# Altium footprint library RcMPPTLib.PcbLib: 82 footprints (part 2 of 6)
Each footprint in its own frame and in the unit in brackets; x right, y up, seen from the top. Pads: shape width x height; smd on the part's side, far side on the other; paste and mask are expansions set on the pad; w line width, h text height; cw(c..) or ccw(c..) is an arc to the next point about the centre after c.
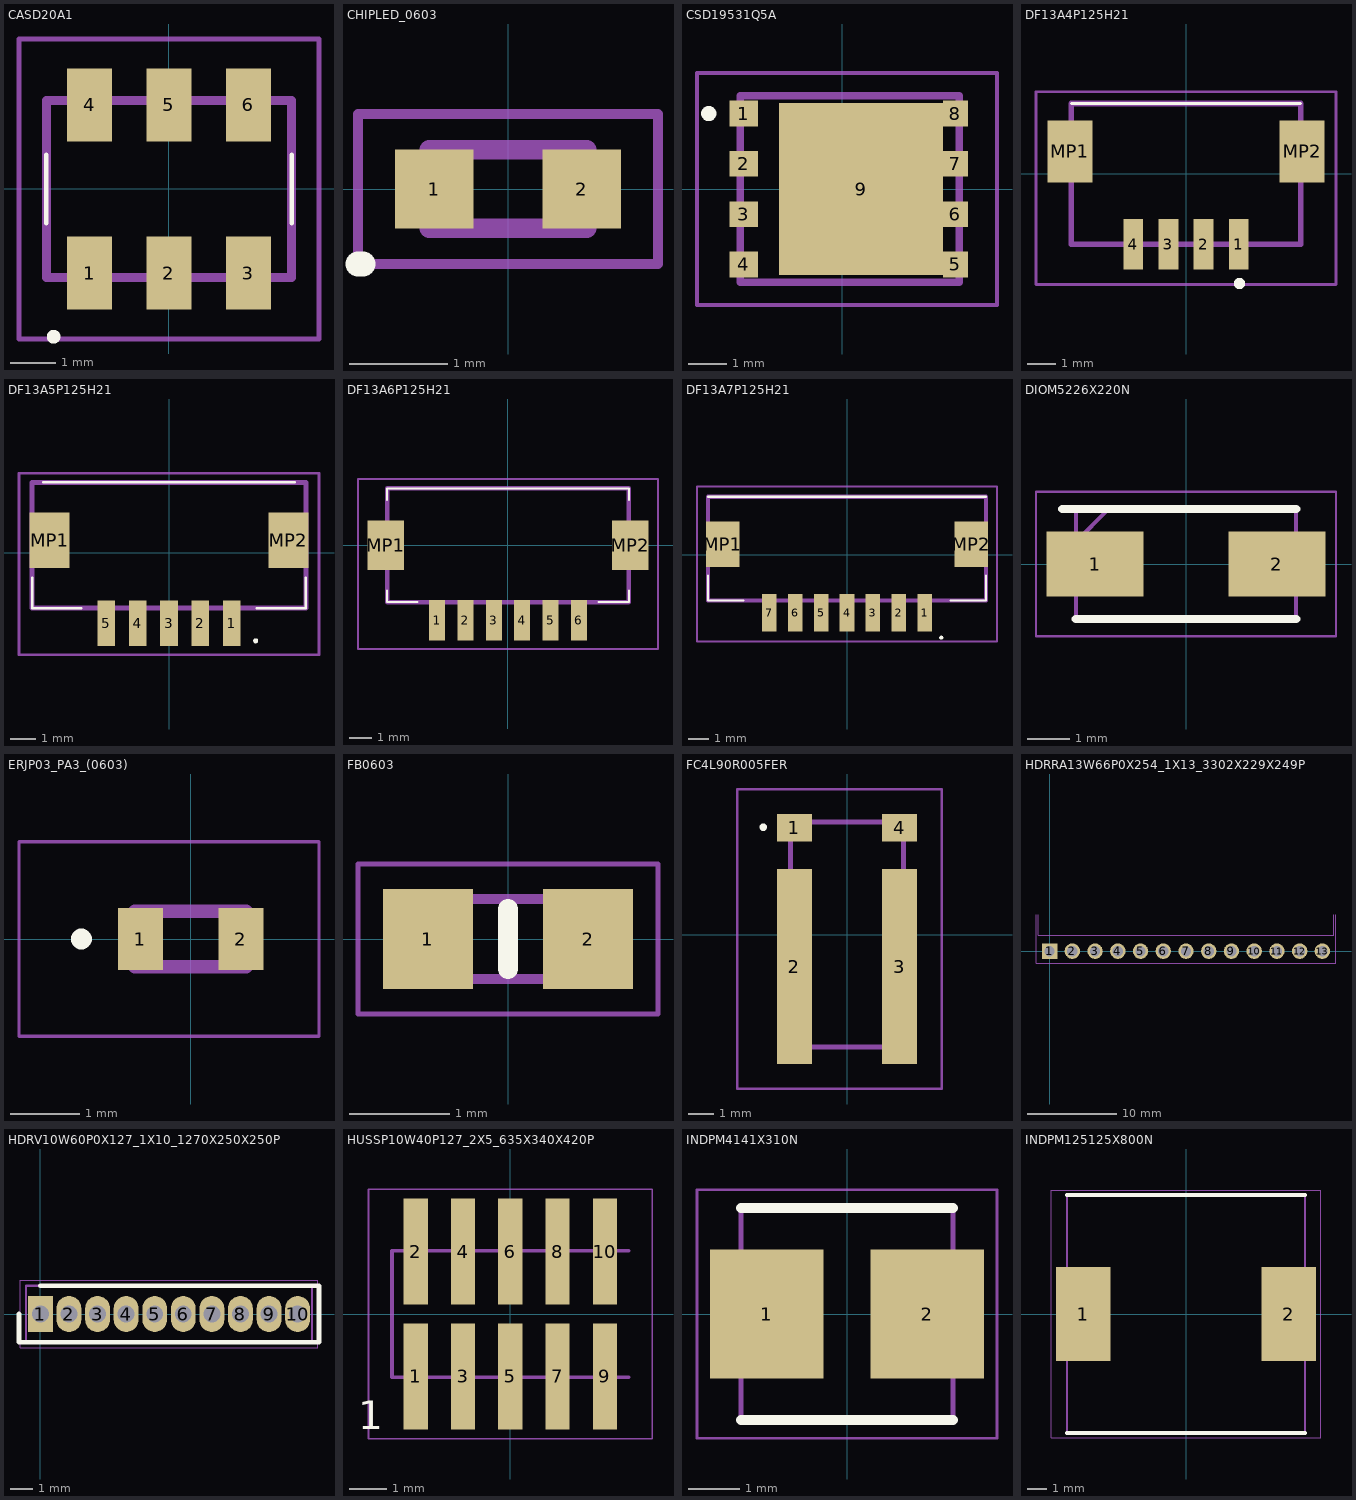
[diagram p1: the footprints below, top view; thin cyan lines are the x and y axes]

## CASD20A1 [mm]
pads (6):
  rect 1x1.6 smd: 1(-1.75,-1.85) 2(0,-1.85) 3(1.75,-1.85) 4(-1.75,1.85) 5(0,1.85) 6(1.75,1.85)
Top Overlay:
  lines w0.1: -2.7,-0.75 -2.7,0.75 -2.7,-0.75 ; 2.7,-0.75 2.7,0.75 2.7,-0.75
  lines w0.2: -2.54,-3.302 ccw(c-2.54,-3.252) -2.54,-3.202 ccw(c-2.54,-3.252) -2.54,-3.302
Mechanical 13:
  lines w0.2: -2.7,-1.95 -2.7,1.95 2.7,1.95 2.7,-1.95 -2.7,-1.95
Mechanical 15:
  lines w0.1: -3.302,-3.302 -3.302,3.302 3.302,3.302 3.302,-3.302 -3.302,-3.302
3D body "CAS-D20A1.stp": height 2.6, standoff 0, extent -2.7,-2.55 2.7,2.55

## CHIPLED_0603 [mm]
pads (2):
  rect 0.8x0.8 smd: 1(-0.75,0) 2(0.75,0)
Top Overlay:
  lines w0.254: -1.524,-0.762 -1.473,-0.762
Mechanical 13:
  lines w0.2: -0.8,-0.4 0.8,-0.4 0.8,0.4 -0.8,0.4 -0.8,-0.4
Mechanical 15:
  lines w0.1: -1.524,-0.762 1.524,-0.762 1.524,0.762 -1.524,0.762 -1.524,-0.762
3D body "LG_Q396-PS-35.stp": height 0.5, standoff 0, extent -0.8,-0.4 0.8,0.4

## CSD19531Q5A [mm]
pads (9):
  rect 0.75x0.675 smd: 1(-2.579,1.98) 2(-2.579,0.66) 3(-2.579,-0.66) 4(-2.579,-1.98)
  rect 0.655x0.675 smd: 5(2.974,-1.98) 6(2.974,-0.66) 7(2.974,0.66) 8(2.974,1.98)
  rect 4.295x4.51 smd: 9(0.496,0)
Top Overlay:
  lines w0.2: -3.602,1.98 ccw(c-3.502,1.98) -3.402,1.98 ccw(c-3.502,1.98) -3.602,1.98
Mechanical 13:
  lines w0.2: -2.677,-2.45 -2.677,2.45 3.073,2.45 3.073,-2.45 -2.677,-2.45
Mechanical 15:
  lines w0.1: -3.81,-3.048 4.064,-3.048 4.064,3.048 -3.81,3.048 -3.81,-3.048
3D body "CSD19531Q5A.stp": height 1.2, standoff 0, extent -2.886,-2.45 3.236,2.45

## DF13A4P125H21 [mm]
pads (6):
  rect 0.7x1.8 smd: 1(1.875,-2.5) 2(0.625,-2.5) 3(-0.625,-2.5) 4(-1.875,-2.5)
  rect 1.6x2.2 smd: MP1(-4.125,0.8) MP2(4.125,0.8)
Top Overlay:
  lines w0.1: -4.075,2.5 4.075,2.5
  lines w0.2: 1.9,-4 cw(c1.9,-3.9) 1.9,-3.8 cw(c1.9,-3.9) 1.9,-4
Mechanical 13:
  lines w0.2: -4.075,-2.5 4.075,-2.5 4.075,2.5 -4.075,2.5 -4.075,-2.5
Mechanical 15:
  lines w0.1: -5.334,-3.937 5.334,-3.937 5.334,2.921 -5.334,2.921 -5.334,-3.937
3D body "DF13A-4P-1.25H_21_.stp": height 3.7, standoff 0, extent -4.765,-3.33 4.765,2.5

## DF13A5P125H21 [mm]
pads (7):
  rect 0.7x1.8 smd: 1(2.5,-2.8) 2(1.25,-2.8) 3(0,-2.8) 4(-1.25,-2.8) 5(-2.5,-2.8)
  rect 1.6x2.2 smd: MP1(-4.75,0.5) MP2(4.75,0.5)
Top Overlay:
  lines w0.1: -5.45,-1 -5.45,-2.2 -3.5,-2.2 ; -5,2.8 5,2.8 ; 3.5,-2.2 5.45,-2.2 5.45,-1 ; 3.4,-3.5 ccw(c3.45,-3.5) 3.5,-3.5 ccw(c3.45,-3.5) 3.4,-3.5
Mechanical 13:
  lines w0.2: -5.45,-2.2 -5.45,2.8 5.45,2.8 5.45,-2.2 -5.45,-2.2
Mechanical 15:
  lines w0.1: -5.969,-4.064 -5.969,3.175 5.969,3.175 5.969,-4.064 -5.969,-4.064
3D body "DF13A-5P-1.25H_21_.stp": height 3.85, standoff 0, extent -5.45,-3.63 5.45,2.8

## DF13A6P125H21 [mm]
pads (8):
  rect 0.7x1.8 smd: 1(-3.125,-3.3) 2(-1.875,-3.3) 3(-0.625,-3.3) 4(0.625,-3.3) 5(1.875,-3.3) 6(3.125,-3.3)
  rect 1.6x2.2 smd: MP1(-5.375,0) MP2(5.375,0)
Top Overlay:
  lines w0.1: -5.325,-2 -5.325,-2.5 -4,-2.5 ; -5.325,2 -5.325,2.5 5.325,2.5 5.325,2 ; 4,-2.5 5.325,-2.5 5.325,-2
Mechanical 13:
  lines w0.2: -5.325,-2.5 -5.325,2.5 5.325,2.5 5.325,-2.5 -5.325,-2.5
Mechanical 15:
  lines w0.1: -6.604,-4.572 -6.604,2.921 6.604,2.921 6.604,-4.572 -6.604,-4.572
3D body "DF13A-6P-1.25H_21_.stp": height 3.85, standoff 0, extent -6.015,-4.13 6.015,2.5

## DF13A7P125H21 [mm]
pads (9):
  rect 0.7x1.8 smd: 1(3.75,-2.8) 2(2.5,-2.8) 3(1.25,-2.8) 4(0,-2.8) 5(-1.25,-2.8) 6(-2.5,-2.8) 7(-3.75,-2.8)
  rect 1.6x2.2 smd: MP1(-6,0.5) MP2(6,0.5)
Top Overlay:
  lines w0.1: -6.7,-1 -6.7,-2.2 -5,-2.2 ; -6.7,2.8 6.7,2.8 ; 5,-2.2 6.7,-2.2 6.7,-1 ; 4.5,-4 cw(c4.55,-4) 4.6,-4 cw(c4.55,-4) 4.5,-4
Mechanical 13:
  lines w0.2: -6.7,-2.2 -6.7,2.8 6.7,2.8 6.7,-2.2 -6.7,-2.2
Mechanical 15:
  lines w0.1: -7.239,-4.191 -7.239,3.302 7.239,3.302 7.239,-4.191 -7.239,-4.191
3D body "DF13A-7P-1.25H_21_.stp": height 3.85, standoff 0, extent -6.7,-3.63 6.7,2.8

## DIOM5226X220N [mm]
pads (2):
  rect 2.3x1.55 smd: 1(-2.15,0) 2(2.15,0)
Top Overlay:
  lines w0.2: -2.925,1.302 2.605,1.302 ; -2.605,-1.302 2.605,-1.302
Mechanical 13:
  lines w0.1: -2.605,0.528 -1.83,1.302 ; -2.605,-1.302 -2.605,1.302 2.605,1.302 2.605,-1.302 -2.605,-1.302
Mechanical 15:
  lines w0.05: -3.55,-1.71 -3.55,1.71 3.55,1.71 3.55,-1.71 -3.55,-1.71
3D body "MBRA120ET3G.stp": height 2.2, standoff 0, extent -2.605,-1.302 2.605,1.302

## ERJP03_PA3_(0603) [mm]
pads (2):
  rect 0.65x0.9 smd: 1(-0.725,0) 2(0.725,0)
Top Overlay:
  circle w0.2: c-1.575,0 r0.05
Mechanical 13:
  lines w0.2: -0.8,-0.4 -0.8,0.4 0.8,0.4 0.8,-0.4 -0.8,-0.4
Mechanical 15:
  lines w0.05: -2.475,-1.4 -2.475,1.4 1.85,1.4 1.85,-1.4 -2.475,-1.4
3D body "ERJ-PA3J104V.stp": height 0.45, standoff 0, extent -0.8,-0.4 0.8,0.4

## FB0603 [mm]
pads (2):
  rect 0.9x1 smd: 1(-0.8,0) 2(0.8,0)
Top Overlay:
  lines w0.2: 0,-0.3 0,0.3
Mechanical 13:
  lines w0.1: -0.8,-0.4 -0.8,0.4 0.8,0.4 0.8,-0.4 -0.8,-0.4
Mechanical 15:
  lines w0.05: -1.5,-0.75 -1.5,0.75 1.5,0.75 1.5,-0.75 -1.5,-0.75
3D body "MPZ1608S221ATA00.stp": height 0.75, standoff 0, extent -0.8,-0.4 0.8,0.4

## FC4L90R005FER [mm]
pads (4):
  rect 1.4x1.1 smd: 1(-2.1,4.275) 4(2.1,4.275)
  rect 1.4x7.8 smd: 2(-2.1,-1.275) 3(2.1,-1.275)
Top Overlay:
  lines w0.2: -3.4,4.3 ccw(c-3.35,4.3) -3.3,4.3 ; -3.4,4.3 cw(c-3.35,4.3) -3.3,4.3 ; -3.4,4.3 ccw(c-3.35,4.3) -3.3,4.3
Mechanical 13:
  lines w0.2: -2.25,-4.5 -2.25,4.5 2.25,4.5 2.25,-4.5 -2.25,-4.5
Mechanical 15:
  lines w0.1: -4.4,-6.175 -4.4,5.825 3.8,5.825 3.8,-6.175 -4.4,-6.175
3D body "FC4L90R005FER.stp": height 0.9, standoff 0, extent -2.69,-5.035 2.69,4.715

## HDRRA13W66P0X254_1X13_3302X229X249P [mm]
pads (13):
  rect 1.725x1.725 hole 1.15: 1(0,0)
  round 1.725 hole 1.15: 2(2.54,0) 3(5.08,0) 4(7.62,0) 5(10.16,0) 6(12.7,0) 7(15.24,0) 8(17.78,0) 9(20.32,0) 10(22.86,0) 11(25.4,0) 12(27.94,0) 13(30.48,0)
Mechanical 13:
  lines w0.1: -1.27,4.07 -1.27,1.78 31.75,1.78 31.75,4.07
Mechanical 15:
  lines w0.05: -1.52,4.064 -1.52,-1.362 32,-1.362 32,4.064
3D body "22-28-8133.stp": height 2.49, standoff -3.05, extent -1.27,-0.33 31.75,12.68

## HDRV10W60P0X127_1X10_1270X250X250P [mm]
pads (10):
  rect 1.1x1.6 hole 0.75: 1(0,0)
  oval 1.1x1.6 hole 0.75: 2(1.27,0) 3(2.54,0) 4(3.81,0) 5(5.08,0) 6(6.35,0) 7(7.62,0) 8(8.89,0) 9(10.16,0) 10(11.43,0)
Top Overlay:
  lines w0.2: -0.95,0 -0.95,-1.25 12.38,-1.25 12.38,1.25 0,1.25
Top Solder:
  lines w0.9: 0,0 11.43,0
Bottom Solder:
  lines w0.9: 0,0 11.43,0
Mechanical 13:
  lines w0.1: -0.635,-1.25 12.065,-1.25 12.065,1.25 -0.635,1.25 -0.635,-1.25
Mechanical 15:
  lines w0.05: -0.885,-1.5 12.315,-1.5 12.315,1.5 -0.885,1.5 -0.885,-1.5
3D body "M52-040023V1045.stp": height 2.5, standoff -2.3, extent -0.635,-1.25 12.065,1.25

## HUSSP10W40P127_2X5_635X340X420P [mm]
pads (10):
  rect 0.65x2.85 smd: 1(-2.54,-1.675) 2(-2.54,1.675) 3(-1.27,-1.675) 4(-1.27,1.675) 5(0,-1.675) 6(0,1.675) 7(1.27,-1.675) 8(1.27,1.675) 9(2.54,-1.675) 10(2.54,1.675)
Top Overlay:
  text "1" at -4.089,-3.099 h0.76
Mechanical 13:
  lines w0.1: 3.175,-1.7 -3.175,-1.7 -3.175,1.7 3.175,1.7
Mechanical 15:
  lines w0.05: -3.81,-3.35 3.81,-3.35 3.81,3.35 -3.81,3.35 -3.81,-3.35
3D body "M50-3600542R.stp": height 5.13, standoff 0, extent -3.325,-2.75 3.325,2.75

## INDPM4141X310N [mm]
pads (2):
  rect 2.2x2.5 smd: 1(-1.55,0) 2(1.55,0)
Top Overlay:
  lines w0.2: -2.05,-2.05 2.05,-2.05 ; -2.05,2.05 2.05,2.05
Mechanical 13:
  lines w0.1: -2.05,-2.05 -2.05,2.05 2.05,2.05 2.05,-2.05 -2.05,-2.05
Mechanical 15:
  lines w0.05: -2.9,-2.4 -2.9,2.4 2.9,2.4 2.9,-2.4 -2.9,-2.4
3D body "78438357100.stp": height 3.1, standoff 0, extent -2.05,-2.05 2.05,2.05

## INDPM125125X800N [mm]
pads (2):
  rect 2.85x4.95 smd: 1(-5.4,0) 2(5.4,0)
Top Overlay:
  lines w0.2: -6.25,-6.25 6.25,-6.25 ; -6.25,6.25 6.25,6.25
Mechanical 13:
  lines w0.1: -6.25,-6.25 6.25,-6.25 6.25,6.25 -6.25,6.25 -6.25,-6.25
Mechanical 15:
  lines w0.05: -7.075,-6.5 7.075,-6.5 7.075,6.5 -7.075,6.5 -7.075,-6.5
3D body "DR127-1R0-R.stp": height 8, standoff 0, extent -6.25,-6.25 6.25,6.25